# Altium footprint library main.PcbLib: 217 footprints (part 1 of 14)
Each footprint in its own frame and in the unit in brackets; x right, y up, seen from the top. Pads: shape width x height; smd on the part's side, far side on the other; paste and mask are expansions set on the pad; w line width, h text height; cw(c..) or ccw(c..) is an arc to the next point about the centre after c.
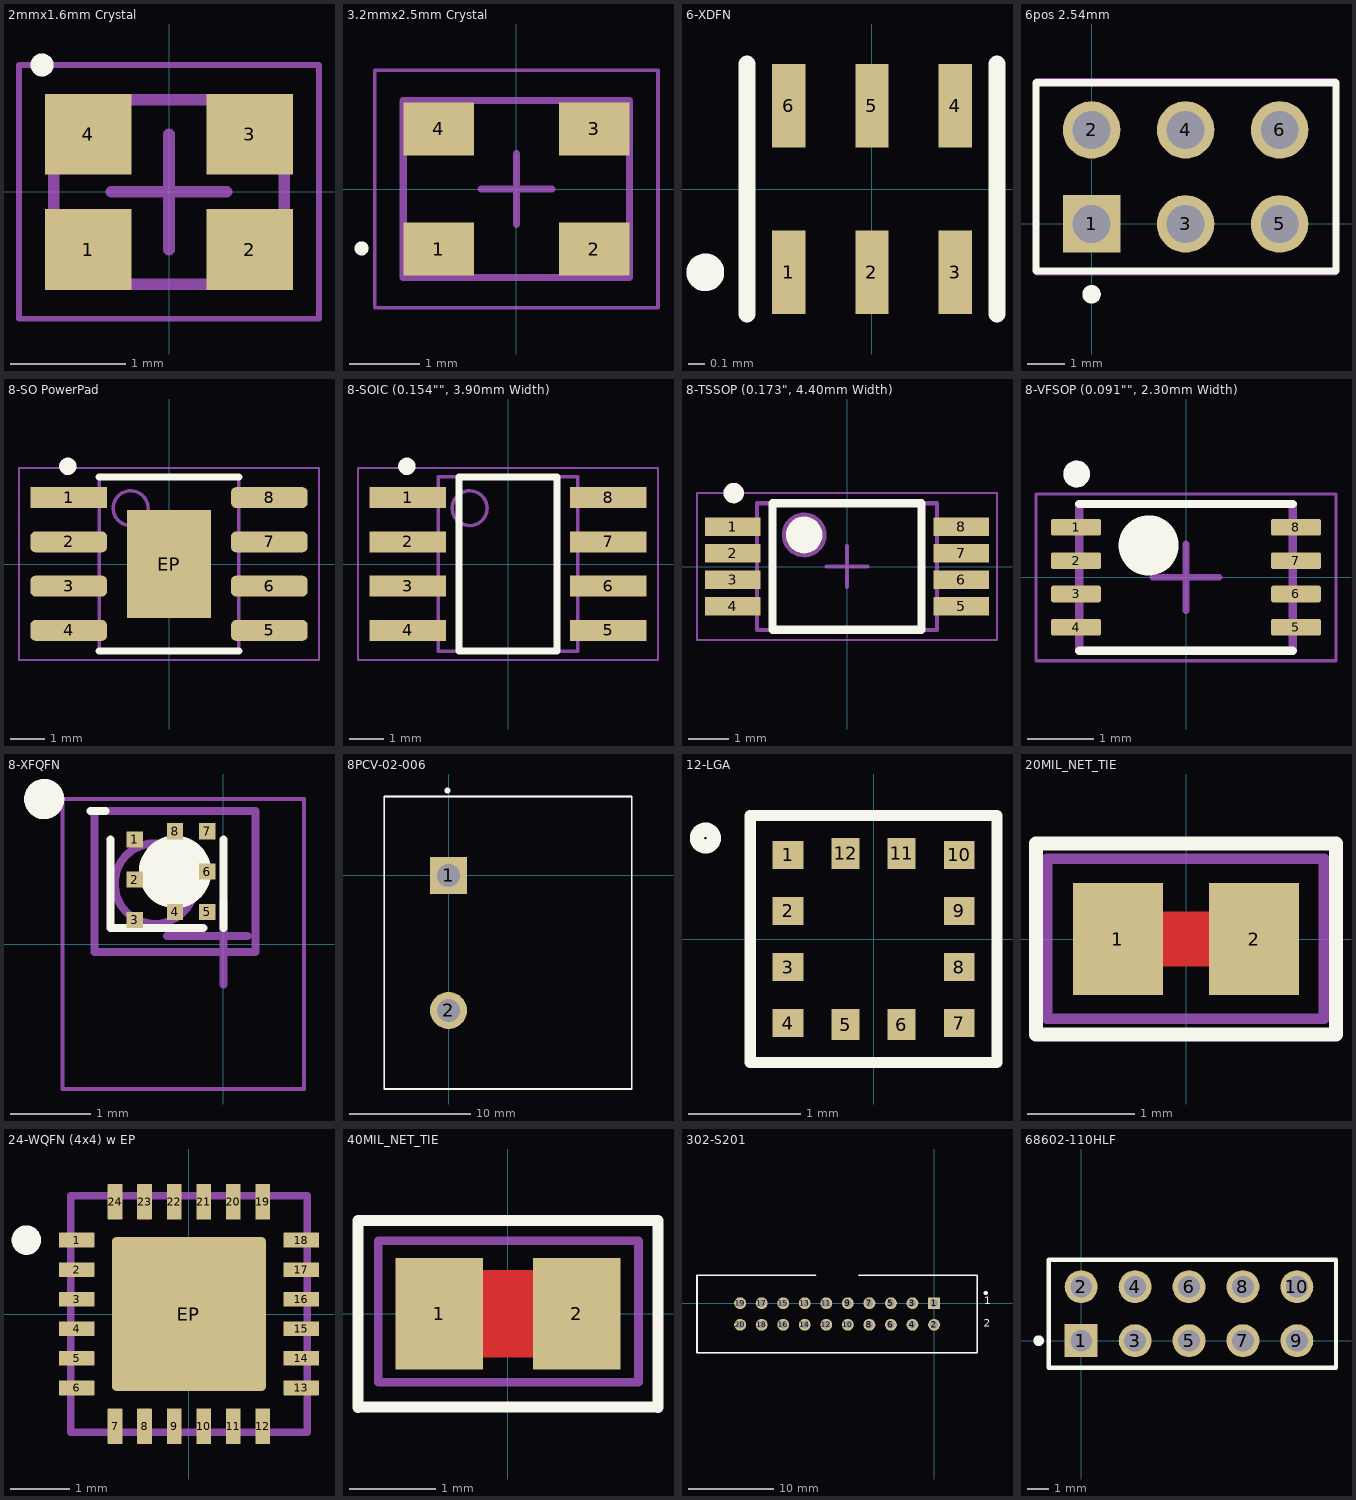
[diagram p0: the footprints below, top view; thin cyan lines are the x and y axes]

## 2mmx1.6mm Crystal [mm] "2mmx1.6mm Crystal"
height 0.7
pads (4):
  rect 0.75x0.7 smd: 1(-0.7,-0.5) 2(0.7,-0.5) 3(0.7,0.5) 4(-0.7,0.5)
Top Overlay:
  circle w0.1: c-1.1,1.1 r0.05
Mechanical 7:
  text ".Designator" at -0.1,-1 h1
Mechanical 13:
  lines w0.1: -1,-0.8 -1,0.8 1,0.8 1,-0.8 -1,-0.8
Mechanical 15:
  lines w0.05: -1.3,-1.1 -1.3,1.1 1.3,1.1 1.3,-1.1 -1.3,-1.1
  lines w0.1: -0.5,0 0.5,0 ; 0,-0.5 0,0.5
3D body: height 0.7, standoff 0, extent -1,-0.8 1,0.8

## 3.2mmx2.5mm Crystal [mm] "3.2mmx2.5mm Crystal"
height 0.7
pads (4):
  rect 1x0.75 smd: 1(-1.1,-0.85) 2(1.1,-0.85) 3(1.1,0.85) 4(-1.1,0.85)
Top Overlay:
  circle w0.1: c-2.19,-0.84 r0.05
Mechanical 7:
  text ".Designator" at -1.105,-1.119 h1
Mechanical 13:
  lines w0.1: -1.6,-1.25 -1.6,1.25 1.6,1.25 1.6,-1.25 -1.6,-1.25
Mechanical 15:
  lines w0.05: -2,-1.68 -2,1.68 2,1.68 2,-1.68 -2,-1.68
  lines w0.1: -0.5,0 0.5,0 ; 0,-0.5 0,0.5
3D body: height 1, standoff 0, extent -1.6,-1.25 1.6,1.25

## 6-XDFN [mm] "6-XDFN (1.5 x 1.5)"
pads (6):
  rect 0.2x0.5 smd: 1(-0.5,-0.5) 2(0,-0.5) 3(0.5,-0.5) 4(0.5,0.5) 5(0,0.5) 6(-0.5,0.5)
Top Overlay:
  circle w0.127: c-1,-0.5 r0.05
  lines w0.1: -0.75,-0.75 -0.75,0.75 ; 0.75,-0.75 0.75,0.75
Mechanical 7:
  text ".Designator" at -3,-0.25 h0.76
3D body "c-20011957-01-1-3d.stp": height 0.41, standoff 0.01, extent -0.75,-0.75 0.75,0.75

## 6pos 2.54mm [mm] "6pos 2.54mm"
height 8.5
pads (6):
  rect 1.55x1.55 hole 1.02: 1(0,0)
  round 1.55 hole 1.02: 2(0,2.54) 3(2.54,0) 4(2.54,2.54) 5(5.08,0) 6(5.08,2.54)
Top Overlay:
  circle w0.25: c0,-1.9 r0.125
  lines w0.2: -1.5,-1.27 -1.5,3.81 6.6,3.81 6.6,-1.27 -1.5,-1.27
Mechanical 7:
  text ".Designator" at 1.052,-0.686 h1.52
Mechanical 15:
  lines w0.05: -1.5,-1.37 -1.5,3.912 6.6,3.912 6.6,-1.37 -1.5,-1.37

## 8-SO PowerPad [mm] "8-SO PowerPad"
height 1.75
pads (9):
  rect 2.2x0.6 smd: 1(-2.875,1.905)
  rrect50% 2.2x0.6 smd: 2(-2.875,0.635) 3(-2.875,-0.635) 4(-2.875,-1.905) 5(2.875,-1.905) 6(2.875,-0.635) 7(2.875,0.635) 8(2.875,1.905)
  rect 2.4x3.1 all layers, no hole: EP(0,0)
Top Overlay:
  circle w0.25: c-2.9,2.8 r0.125
  lines w0.2: -2,-2.5 2,-2.5 ; -2,2.5 2,2.5
Mechanical 7:
  text ".Designator" at -2.921,-0.762 h1.52
Mechanical 13:
  circle w0.1: c-1.1,1.6 r0.5
  lines w0.1: -2,-2.5 -2,2.5 2,2.5 2,-2.5 -2,-2.5
Mechanical 15:
  lines w0.05: -4.3,-2.75 -4.3,2.75 4.3,2.75 4.3,-2.75 -4.3,-2.75
  lines w0.1: -0.5,0 0.5,0 ; 0,-0.5 0,0.5
3D body "User Library-so8-3.STEP": height 1.7, standoff 0, extent -3,-2.45 3,2.45

## 8-SOIC (0.154"", 3.90mm Width) [mm] "8-SOIC (0.154\"\", 3.90mm Width)"
height 1.75
pads (8):
  rect 2.2x0.6 smd: 1(-2.875,1.905) 2(-2.875,0.635) 3(-2.875,-0.635) 4(-2.875,-1.905) 5(2.875,-1.905) 6(2.875,-0.635) 7(2.875,0.635) 8(2.875,1.905)
Top Overlay:
  circle w0.25: c-2.9,2.8 r0.125
  lines w0.2: -1.4,-2.5 1.4,-2.5 1.4,2.5 -1.4,2.5 -1.4,-2.5
Mechanical 7:
  text ".Designator" at -2.921,-0.762 h1.52
Mechanical 13:
  circle w0.1: c-1.1,1.6 r0.5
  lines w0.1: -2,-2.5 2,-2.5 2,2.5 -2,2.5 -2,-2.5
Mechanical 15:
  lines w0.05: -4.3,-2.75 4.3,-2.75 4.3,2.75 -4.3,2.75 -4.3,-2.75
3D body "User Library-so8-3.STEP": height 1.7, standoff 0, extent -3,-2.45 3,2.45

## 8-TSSOP (0.173", 4.40mm Width) [mm] "8-TSSOP"
height 1.1
pads (8):
  rect 1.35x0.45 smd: 1(-2.8,0.975) 2(-2.8,0.325) 3(-2.8,-0.325) 4(-2.8,-0.975) 5(2.8,-0.975) 6(2.8,-0.325) 7(2.8,0.325) 8(2.8,0.975)
Top Overlay:
  circle w0.6: c-1.05,0.775 r0.15
  circle w0.25: c-2.775,1.8 r0.125
  lines w0.2: -1.825,-1.55 1.825,-1.55 1.825,1.55 -1.825,1.55 -1.825,-1.55
Mechanical 7:
  text ".Designator" at -2.57,-0.572 h1.52
Mechanical 13:
  circle w0.1: c-1.05,0.775 r0.5
  lines w0.1: -2.2,-1.55 2.2,-1.55 2.2,1.55 -2.2,1.55 -2.2,-1.55
Mechanical 15:
  lines w0.05: -3.675,-1.8 3.675,-1.8 3.675,1.8 -3.675,1.8 -3.675,-1.8
  lines w0.1: -0.5,0 0.5,0 ; 0,-0.5 0,0.5
3D body "User Library-TSS0P8-1.SLDPRT": height 1.09, standoff 0, extent -3.14,-1.5 3.14,1.5

## 8-VFSOP (0.091"", 2.30mm Width) [mm] "8-VFSOP (0.091\"\", 2.30mm Width)"
height 1.1
pads (8):
  rrect25% 0.75x0.25 smd: 1(-1.65,0.75) 2(-1.65,0.25) 3(-1.65,-0.25) 4(-1.65,-0.75) 5(1.65,-0.75) 6(1.65,-0.25) 7(1.65,0.25) 8(1.65,0.75)
Top Overlay:
  circle w0.6: c-0.56,0.48 r0.15
  circle w0.2: c-1.64,1.55 r0.1
  lines w0.127: -1.6,-1.1 1.6,-1.1 ; -1.6,1.1 1.6,1.1
Mechanical 7:
  text ".Designator" at -0.87,-0.51 h1.52
Mechanical 13:
  circle w0.2: c-1.64,1.55 r0.1
  lines w0.127: -1.6,-1.1 -1.6,1.1 1.6,1.1 1.6,-1.1 -1.6,-1.1
Mechanical 15:
  lines w0.05: -2.25,-1.25 -2.25,1.25 2.25,1.25 2.25,-1.25 -2.25,-1.25
  lines w0.1: -0.5,0 0.5,0 ; 0,-0.5 0,0.5
3D body "DCU8.step": height 0.89, standoff 0, extent -1.6,-1.054 1.6,1.054

## 8-XFQFN [mm] "8-XFQFN, 8-pads, Body 1.10x1.10mm, Pitch 0.40mm"
height 1.1
pads (8):
  rect 0.2x0.2 smd: 1(-1.1,1.3) 2(-1.1,0.8) 3(-1.1,0.3) 4(-0.6,0.4) 5(-0.2,0.4) 6(-0.2,0.9) 7(-0.2,1.4) 8(-0.6,1.4)
Top Overlay:
  circle w0.25: c-2.225,1.8 r0.125
  circle w0.6: c-0.6,0.896 r0.15
  lines w0.1: -1.65,1.65 -1.465,1.65 ; -1.4,1.3 -1.4,0.2 -0.25,0.2 ; 0,0.2 0,1.3
Mechanical 7:
  text ".Designator" at -3,2.8 h1.52
Mechanical 13:
  circle w0.1: c-0.85,0.75 r0.5
  lines w0.1: 0.4,1.213 0.4,1.65 -1.6,1.65 -1.6,-0.1 0.4,-0.1 0.4,0.338 0.4,1.438
Mechanical 15:
  lines w0.05: -2,-1.8 -2,1.8 1,1.8 1,-1.8 -2,-1.8
  lines w0.1: -0.7,0.1 0.3,0.1 ; 0,-0.5 0,0.5
3D body "IC_Texas_Instruments_TPS552882_eec.STEP": height 1, standoff 0, extent -1.75,-2.1 1.75,1.9

## 8PCV-02-006 [mil] "8PCV-02-006"
pads (2):
  rect 120x120 hole 75: 1(0,0)
  round 120 hole 75: 2(0,-438)
Top Overlay:
  circle w9.84: c-3.94,275.59 r4.92
  lines w6: -208.66,-692.91 -208.66,255.91 594.49,255.91 594.49,-692.91 -208.66,-692.91
Mechanical 7:
  text ".Designator" at -90.55,-244.09 h60
Mechanical 15:
  lines w6: 62.99,-692.91 -208.66,-692.91 -208.66,255.91 594.49,255.91
3D body "c-5-1437657-7-r-3d.stp": height 770, standoff -185, extent -207.09,-692.09 592.91,255.91

## 12-LGA [mm] "12-LGA (2mmx2mm)"
pads (12):
  rect 0.275x0.25 smd: 1(-0.763,0.75) 2(-0.763,0.25) 3(-0.763,-0.25) 4(-0.763,-0.75) 7(0.763,-0.75) 8(0.763,-0.25) 9(0.763,0.25) 10(0.763,0.75)
  rect 0.25x0.275 smd: 5(-0.25,-0.763) 6(0.25,-0.763) 11(0.25,0.763) 12(-0.25,0.763)
Top Overlay:
  circle w0.127: c-1.5,0.9 r0.075
  lines w0.1: -1.1,-1.1 -1.1,1.1 1.1,1.1 1.1,-1.1 -1.1,-1.1
Mechanical 7:
  text ".Designator" at -4,0 h0.76
3D body "MXC6655XA_MEM.step": height 0.99, standoff 0, extent -1.003,-1.003 1.003,1.003

## 20MIL_NET_TIE [mil] "Signal Net Tie"
height 70.87
pads (2):
  rect 33x41 smd paste-78.74: 1(-25,0) 2(25,0)
Top Layer:
  rectangle: -9,-10 9,10
Top Overlay:
  lines w5: -55,-35 -55,35 55,35 55,-35 -55,-35
Mechanical 15:
  lines w3.94: -50.98,-29.25 -50.98,29.41 ; -50.98,-29.25 50.59,-29.25 ; -50.98,-29.25 50.59,-29.25 ; -50.98,-29.25 -50.98,29.41 ; -50.98,29.41 50.59,29.41 ; -50.98,29.41 50.59,29.41 ; 50.59,-29.25 50.59,29.41 ; 50.59,-29.25 50.59,29.41

## 24-WQFN (4x4) w EP [mm] "24-WQFN (4x4) w EP"
pads (25):
  rrect10% 0.6x0.25 smd: 1(-1.9,1.25) 2(-1.9,0.75) 3(-1.9,0.25) 4(-1.9,-0.25) 5(-1.9,-0.75) 6(-1.9,-1.25) 13(1.9,-1.25) 14(1.9,-0.75) 15(1.9,-0.25) 16(1.9,0.25) 17(1.9,0.75) 18(1.9,1.25)
  rrect10% 0.25x0.6 smd: 7(-1.25,-1.9) 8(-0.75,-1.9) 9(-0.25,-1.9) 10(0.25,-1.9) 11(0.75,-1.9) 12(1.25,-1.9) 19(1.25,1.9) 20(0.75,1.9) 21(0.25,1.9) 22(-0.25,1.9) 23(-0.75,1.9) 24(-1.25,1.9)
  rrect5% 2.6x2.6 smd: EP(0,0)
Top Overlay:
  circle w0.25: c-2.75,1.25 r0.125
Mechanical 7:
  text ".Designator" at -0.8,-0.5 h1.52
Mechanical 13:
  lines w0.127: -2,-2 -2,2 2,2 2,-2 -2,-2
Mechanical 15:
  lines w0.05: -2,-2 -2,2 2,2 2,-2 -2,-2
3D body: height 0.8, standoff 0, extent -2,-2 2,2

## 40MIL_NET_TIE [mil] "Signal Net Tie"
height 393.7
pads (2):
  rect 40x51 smd paste-78.74: 1(-31.5,0) 2(31.5,0)
Top Layer:
  rectangle: -13.18,-20 13.2,20
Top Overlay:
  lines w5: -68.76,-43 -68.76,42.74 67.95,42.74 ; -68.76,-42.76 67.95,-42.76 ; 68.78,-43 68.78,42.74
Mechanical 15:
  lines w3.94: -59.45,-31.5 59.84,-31.5 ; -59.45,-31.5 -59.45,33.47 ; -59.45,-31.5 -59.45,33.47 ; -59.45,-31.5 59.84,-31.5 ; -59.45,33.47 59.84,33.47 ; -59.45,33.47 59.84,33.47 ; 59.84,-31.5 59.84,33.47 ; 59.84,-31.5 59.84,33.47

## 302-S201 [mil] "302-S201"
pads (20):
  rect 55x55 hole 35: 1(0,0)
  round 55 hole 35: 2(0,-100) 3(-100,0) 4(-100,-100) 5(-200,0) 6(-200,-100) 7(-300,0) 8(-300,-100) 9(-400,0) 10(-400,-100) 11(-500,0) 12(-500,-100) 13(-600,0) 14(-600,-100) 15(-700,0) 16(-700,-100) 17(-800,0) 18(-800,-100) 19(-900,0) 20(-900,-100)
Top Overlay:
  circle w9.84: c240.16,47.24 r4.92
  lines w7.87: -550,130 -1100,130 -1100,-230 200,-230 200,130 -350,130
  text "2" at 229.77,-120.7 h60
  text "1" at 232.28,-15.75 h60
Mechanical 7:
  text ".Designator" at -596.92,-64.79 h30
Mechanical 15:
  lines w5: -350,130 200,130 ; -1100,-230 200,-230 ; -1100,-230 200,-230 ; -1100,-230 -1100,130 ; -1100,-230 -1100,130 ; -1100,130 -550,130 -1100,130 ; 200,-230 200,130 ; 200,-230 200,130
3D body "User Library-302-S201 (2).step": height 354.33, standoff -122.05, extent -1099.21,-230.31 200.79,127.95

## 68602-110HLF [mm] "68602-110HLF"
height 8.5
pads (10):
  rect 1.55x1.55 hole 1.02: 1(0,0)
  round 1.55 hole 1.02: 2(0,2.54) 3(2.54,0) 4(2.54,2.54) 5(5.08,0) 6(5.08,2.54) 7(7.62,0) 8(7.62,2.54) 9(10.16,0) 10(10.16,2.54)
Top Overlay:
  circle w0.25: c-2,0 r0.125
  lines w0.2: -1.52,-1.27 -1.52,3.81 12,3.81 12,-1.27 -1.52,-1.27
Mechanical 7:
  text ".Designator" at -0.7,0.7 h1.52
Mechanical 15:
  lines w0.05: -1.5,-1.3 -1.5,3.8 12,3.8 12,-1.3 -1.5,-1.3